# Altium footprint library My Library.PcbLib: 872 footprints (part 10 of 55)
Each footprint in its own frame and in the unit in brackets; x right, y up, seen from the top. Pads: shape width x height; smd on the part's side, far side on the other; paste and mask are expansions set on the pad; w line width, h text height; cw(c..) or ccw(c..) is an arc to the next point about the centre after c.
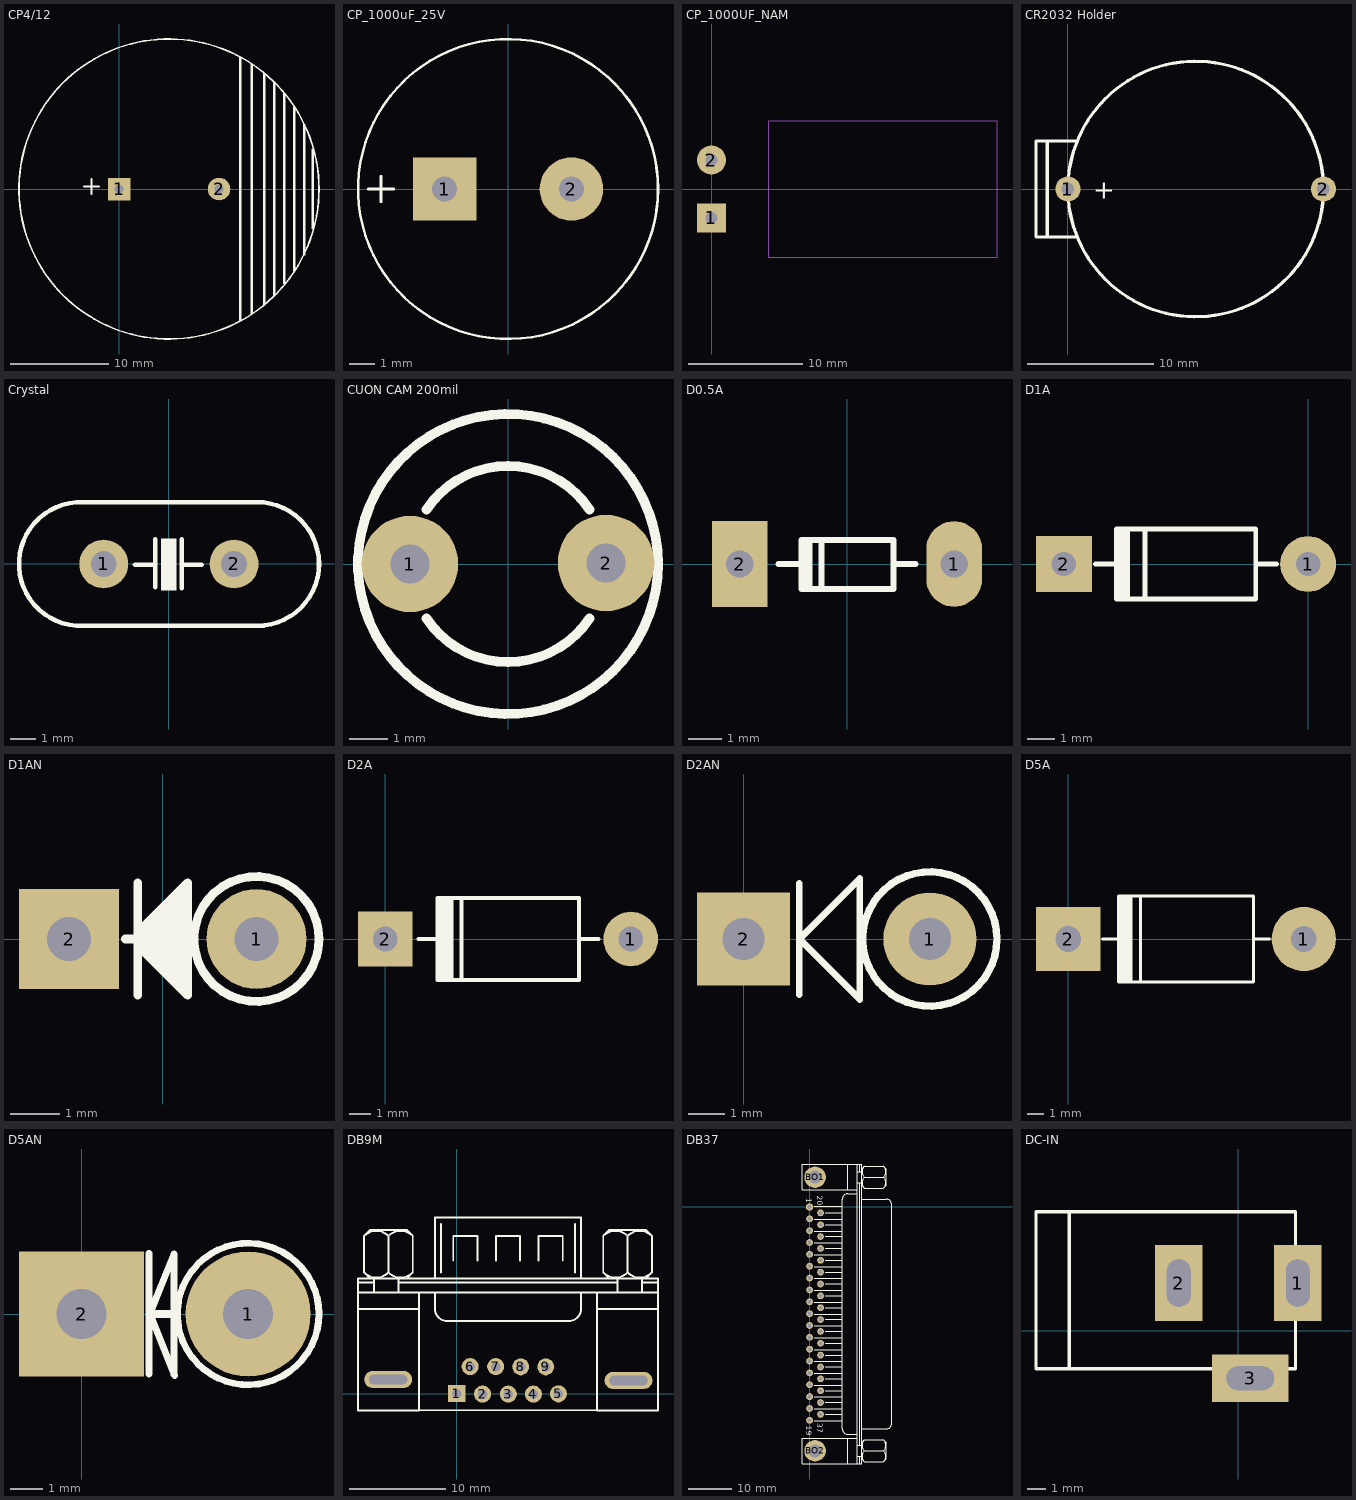
[diagram p9: the footprints below, top view; thin cyan lines are the x and y axes]

## CP4/12 [mil] "Tu hoa 220uF/450V"
height 600
pads (2):
  rect 90x90 hole 35: 1(0,0)
  round 90 hole 35: 2(400,0)
Top Overlay:
  circle w7: c200,0 r600
  rectangle: 695,-330 705,330
  rectangle: 655,-380 665,385
  rectangle: 615,-425 625,430
  rectangle: 575,-465 585,465
  rectangle: 525,-500 535,500
  rectangle: 480,-530 490,530
  rectangle: 735,-265 745,260
  rectangle: 770,-160 780,160
  lines w7: -140,10 -80,10 ; -110,-20 -110,40

## CP_1000uF_25V [mil]
pads (2):
  rect 100x100 hole 40: 1(-100,0)
  round 100 hole 40: 2(100,0)
Top Overlay:
  circle w4: c0,0 r236.22
  lines w4: -220,0 -180,0 ; -200,-20 -200,20
3D body: height 118.11, standoff 39.37, extent 236.3,-5.66 237,5.66
3D body: height 511.81, standoff 393.7, extent 236.3,-5.66 237,5.66
3D body: height 791.34, standoff 0, extent 223.5,-76.82 236.8,77.63
3D body: height 39.37, standoff -39.37, extent 84.27,-15.73 115.73,15.73
3D body: height 39.37, standoff -39.37, extent -115.73,-15.73 -84.27,15.73
3D body: height 791.34, standoff 748.03, extent -220.02,-196.87 196.87,196.87
3D body: height 787.4, standoff 0, extent -236.2,-236.2 236.2,236.2

## CP_1000UF_NAM [mil]
height 47.24
pads (2):
  rect 100x100 hole 40: 1(-1,-100)
  round 100 hole 40: 2(-1,100)
Mechanical 1:
  lines w4: 197.24,-236.22 983.86,-236.22 983.86,236.22 197.24,236.22 197.24,-236.22
3D body: height 589, standoff 196.85, extent 196.87,-196.83 984.27,196.09
3D body: height 628.06, standoff 157.48, extent 197.27,-236.2 983.88,235.31
3D body: height 413.23, standoff 374.02, extent -3,78.74 233.22,118.03
3D body: height 413.39, standoff 374.02, extent -21.05,79.95 18.11,119.15
3D body: height 393.7, standoff -78.74, extent -20.66,80.34 18.67,119.67
3D body: height 393.7, standoff -78.74, extent -20.66,-119.66 18.67,-80.33
3D body: height 413.39, standoff 374.02, extent -21.05,-120.05 18.11,-80.85
3D body: height 413.23, standoff 374.02, extent -3,-121.26 233.22,-81.97

## CR2032 Holder [mm]
pads (2):
  round 2 hole 1: 1(0,0) 2(20.32,0)
Top Overlay:
  circle w0.254: c10.16,0 r10.161
  lines w0.254: -1.651,-3.81 -1.651,3.81 ; 0.635,-3.81 -2.54,-3.81 -2.54,3.81 0.635,3.81
  text "+" at 2.032,-0.762 h1.52

## Crystal [mm]
pads (2):
  round 1.905 hole 1: 1(-2.54,0) 2(2.54,0)
Top Overlay:
  region: 0.292,0.991 0.292,-1.016 -0.292,-1.016 -0.292,0.991
  lines w0.178: -3.349,-2.412 cw(c-3.429,0) -3.348,2.412 ; -3.302,-2.413 3.452,-2.413 ; -3.302,2.413 3.429,2.413 cw(c3.437,0) 3.453,-2.413 ; -1.321,-0.025 -0.533,-0.025 ; -0.533,-0.914 -0.533,0.965 ; 0.508,-0.94 0.508,0.965 ; 0.508,-0.025 1.27,-0.025
3D body "SW3dPS-HP49US.STEP": height 3.5, standoff -4, extent -5.635,-2.286 5.715,2.364

## CUON CAM 200mil [mm]
pads (2):
  round 2.5 hole 1: 1(-2.54,0) 2(2.54,0.025)
Top Overlay:
  circle w0.254: c0,0 r3.886
  lines w0.254: -2.114,-1.409 ccw(c0,0) 2.114,-1.409 ; -2.114,1.409 cw(c0,0) 2.114,1.409

## D0.5A [mil] "Diode muoi, W 80mil, L 300mil"
height 80
pads (2):
  oval 65x100 hole 32: 1(125,0)
  rect 65x100 hole 32: 2(-125,0)
Top Overlay:
  rectangle: -55,-30 -40,25
  lines w7: -80,0 -53,0 ; -30,-29 -30,28 ; 54,0 80,0 ; -53,-29 -53,28 54,28 54,-29 -53,-29
3D body "SW3dPS-1N4148.STEP": height 61.22, standoff -50, extent -108.5,-32.96 108.5,32

## D1A [mil] "Diode 1A, W 100mil, L 350mil"
height 100
pads (2):
  round 80 hole 35: 1(0,0)
  rect 80x80 hole 35: 2(-350,0)
Top Overlay:
  rectangle: -275,-50 -255,50
  lines w7: -305,0 -275,0 ; -275,-16 -275,0 ; -275,21 -275,0 ; -234,-50 -234,47 ; -75,0 -45,0 ; -275,0 -275,50 -75,50 -75,-50 -275,-50 -275,0
3D body "SW3dPS-do_35.STEP": height 84.5, standoff -100, extent -386.49,-33 34.49,36

## D1AN [mil] "Diode 1A, W 100mil, L 150mil"
height 100
pads (2):
  round 80 hole 35: 1(75,0)
  rect 80x80 hole 35: 2(-75,0)
Top Overlay:
  circle w7: c75,0 r50
  region: 20,40 20,-40 15,-40 -20,-5 -20,5
  lines w7: -30,0 -20,0 ; -20,-45 -20,45 ; -20,-5 -20,5 20,45 20,-45 -20,-5
3D body "SW3dPS-1N4007_Stand.STEP": height 252.32, standoff -78.14, extent -64,-50 104,55

## D2A [mil] "Diode 2A, W 150mil, L 450mil"
height 100
pads (2):
  round 100 hole 45: 1(450,0)
  rect 100x100 hole 45: 2(0,0)
Top Overlay:
  rectangle: 95,-75 125,75
  lines w7: 61,0 96,0 ; 96,-31 96,0 ; 96,32 96,0 ; 140,-75 140,75 ; 355,0 391,0 ; 96,-75 96,75 355,75 355,-75 96,-75
3D body "SW3DPS-DIODE0_4-DEFAULT.STEP": height 100.5, standoff -100, extent 5,-47 435,54

## D2AN [mil] "Diode 2A, W 150mil, L 450mil"
height 100
pads (2):
  round 100 hole 45: 1(200,0)
  rect 100x100 hole 45: 2(0,0)
Top Overlay:
  circle w8: c200,0 r72.11
  lines w7: 60,-60 60,60 ; 125,50 125,65 60,0 125,-65 125,55
3D body "SW3dPS-Zener 1W_Stand.STEP": height 252.32, standoff -78.14, extent 46.01,-49.99 214.01,55

## D5A [mil] "Diode 5A, W 200mil, L 550mil"
height 150
pads (2):
  round 150 hole 60: 1(550,0)
  rect 150x150 hole 60: 2(0,0)
Top Overlay:
  rectangle: 120,-100 150,100
  lines w7: 80,0 118,0 ; 118,-44 118,0 ; 118,46 118,0 ; 169,-99 169,100 ; 432,0 470,0 ; 118,-100 432,-100 432,100 118,100 118,-100
3D body "SW3dPS-BYW98.STEP": height 254.33, standoff -86.22, extent -51.87,-106 589.87,102.66

## D5AN [mil] "Diode 5A, W 200mil, L 250mil"
height 150
pads (2):
  round 150 hole 60: 1(200,0)
  rect 150x150 hole 60: 2(0,0)
Top Overlay:
  circle w8: c200,0 r85
  lines w8: 81,-72 81,73 ; 82,0 111,72 111,-73 ; 83,-2 112,-74
  lines w10: 82,0 113,0
3D body "SW3dPS-Zener 1W_Stand.STEP": height 252.32, standoff -78.14, extent 21,-73.99 189,31

## DB9M [mil]
pads (11):
  rect 70x70 hole 39.37 unplated: 1(0,0)
  round 70 hole 39.37 unplated: 2(106,-2) 3(212,-2) 4(315,-2) 5(418,-1) 6(55,111) 7(160,111) 8(263,110) 9(366,110)
  oval 196.85x70 hole 39.37 slot 157.48 at 0 deg unplated: ""(-282,58) ""(706,54)
Top Overlay:
  lines w7.87: -190,-68.67 639,-68.67
  lines w8: -406,348 -156,348 ; -406,414.67 827.33,414.67 ; -406,456.33 -339.33,456.33 ; -381.09,497.91 ccw(c-331,548) -280.91,497.91 ; -381.09,648.09 cw(c-331,598) -280.91,648.09 ; -356,473 -381,498 -381,648 -356,673 -206,673 -181,648 -181,498 -206,473 ; -339.33,414.67 -339.33,473 ; -281.09,497.91 ccw(c-231,548) -180.91,497.91 ; -281.09,648.09 cw(c-231,598) -180.91,648.09 ; -281,498 -281,648 ; -239.33,414.67 -239.33,473 ; -239.33,456.33 660.67,456.33 ; -156,414.67 -156,-68.67 -406,-68.67 -406,473 827.33,473 827.33,-68.67 577.33,-68.67 577.33,414.67 ; -89.33,414.67 -89.33,348 ccw(c-39.33,348) -39.33,298 460.67,298 ccw(c460.67,348) 510.67,348 510.67,414.67 ; -89.33,473 -89.33,723 510.67,723 510.67,473 ; -64.33,498 -64.33,698 ; -14.33,548 -14.33,648 85.67,648 85.67,548 ; 160.67,548 160.67,648 260.67,648 260.67,548 ; 335.67,548 335.67,648 435.67,648 435.67,548 ; 485.67,498 485.67,698 ; 577.33,348 827.33,348 ; 602.25,497.91 ccw(c652.33,548) 702.42,497.91 ; 602.25,648.09 cw(c652.33,598) 702.42,648.09 ; 627.33,473 602.33,498 602.33,648 627.33,673 777.33,673 802.33,648 802.33,498 777.33,473 ; 660.67,414.67 660.67,473 ; 702.25,497.91 ccw(c752.33,548) 802.42,497.91 ; 702.25,648.09 cw(c752.33,598) 802.42,648.09 ; 702.33,498 702.33,648 ; 760.67,414.67 760.67,473 ; 760.67,456.33 827.33,456.33
3D body "DB9.step": height 494.59, standoff -152.06, extent -395.29,-63 817.3,661.41

## DB37 [mil]
pads (39):
  oct 62x62 hole 35: 1(0,0)
  round 62 hole 35: 2(0,-108.33) 3(0,-216.67) 4(0,-325) 5(0,-433.33) 6(0,-541.67) 7(0,-650) 8(0,-758.33) 9(0,-866.67) 10(0,-975) 11(0,-1083.33) 12(0,-1191.67) 13(0,-1300) 14(0,-1408.33) 15(0,-1516.67) 16(0,-1625) 17(0,-1733.33) 18(0,-1841.67) 19(0,-1950) 20(100,-54.17) 21(100,-162.5) 22(100,-270.83) 23(100,-379.17) 24(100,-487.5) 25(100,-595.83) 26(100,-704.17) 27(100,-812.5) 28(100,-920.83) 29(100,-1029.17) 30(100,-1137.5) 31(100,-1245.83) 32(100,-1354.17) 33(100,-1462.5) 34(100,-1570.83) 35(100,-1679.17) 36(100,-1787.5) 37(100,-1895.83)
  round 196.67 hole 118.33: BO1(50,271.67) BO2(50,-2228.33)
Top Overlay:
  lines w8: 41.67,-1953.33 291.67,-1953.33 300,-1953.33 ; 41.67,-1845 291.67,-1845 300,-1845 ; 41.67,-1736.67 291.67,-1736.67 300,-1736.67 ; 41.67,-1628.33 291.67,-1628.33 300,-1628.33 ; 41.67,-1520 291.67,-1520 300,-1520 ; 41.67,-1411.67 291.67,-1411.67 300,-1411.67 ; 41.67,-1303.33 291.67,-1303.33 300,-1303.33 ; 41.67,-1195 291.67,-1195 300,-1195 ; 41.67,-1086.67 300,-1086.67 ; 41.67,-978.33 300,-978.33 ; 41.67,-870 291.67,-870 300,-870 ; 41.67,-761.67 291.67,-761.67 300,-761.67 ; 41.67,-653.33 291.67,-653.33 300,-653.33 ; 41.67,-545 291.67,-545 300,-545 ; 41.67,-436.67 291.67,-436.67 300,-436.67 ; 41.67,-328.33 291.67,-328.33 300,-328.33 ; 41.67,-220 291.67,-220 300,-220 ; 41.67,-111.67 291.67,-111.67 300,-111.67 ; 41.67,5 300,5 ; 141.67,-1895 300,-1895 ; 141.67,-1786.67 300,-1786.67 ; 141.67,-1678.33 300,-1678.33 ; 141.67,-1570 300,-1570 ; 141.67,-1461.67 300,-1461.67 ; 141.67,-1353.33 300,-1353.33 ; 141.67,-1245 300,-1245 ; 141.67,-1136.67 300,-1136.67 ; 141.67,-1028.33 300,-1028.33 ; 141.67,-920 300,-920 ; 141.67,-811.67 300,-811.67 ; 141.67,-703.33 300,-703.33 ; 141.67,-595 300,-595 ; 141.67,-486.67 300,-486.67 ; 141.67,-378.33 300,-378.33 ; 141.67,-270 300,-270 ; 141.67,-161.67 300,-161.67 ; 141.67,-53.33 300,-53.33 ; 350,-2345 350,-2111.67 ; 350,155 350,388.33 ; 433.33,-2345 433.33,388.33 ; 433.33,-2278.33 475,-2278.33 ; 433.33,-2178.33 475,-2178.33 ; 433.33,-2111.67 -66.67,-2111.67 -66.67,-2345 475,-2345 475,388.33 -66.67,388.33 -66.67,155 433.33,155 ; 433.33,-2078.33 350,-2078.33 cw(c350,-2028.33) 300,-2028.33 300,71.67 cw(c350,71.67) 350,121.67 433.33,121.67 ; 433.33,221.67 475,221.67 ; 433.33,321.67 475,321.67 ; 458.33,-2345 458.33,-2278.33 ; 458.33,-2178.33 458.33,221.67 ; 458.33,321.67 458.33,388.33 ; 475,-2303.33 500,-2328.33 675,-2328.33 700,-2303.33 700,-2153.33 675,-2128.33 500,-2128.33 475,-2153.33 ; 475,-2028.33 700,-2028.33 ccw(c700,-1978.33) 750,-1978.33 750,21.67 ccw(c700,21.67) 700,71.67 475,71.67 ; 475,196.67 500,171.67 675,171.67 700,196.67 700,346.67 675,371.67 500,371.67 475,346.67 ; 499.91,-2328.42 cw(c550,-2278.33) 499.91,-2228.25 ; 499.91,-2228.42 cw(c550,-2178.33) 499.91,-2128.25 ; 499.91,171.58 cw(c550,221.67) 499.91,271.75 ; 499.91,271.58 cw(c550,321.67) 499.91,371.75 ; 500,-2228.33 675,-2228.33 ; 500,271.67 675,271.67 ; 675.09,-2328.42 ccw(c625,-2278.33) 675.09,-2228.25 ; 675.09,-2228.42 ccw(c625,-2178.33) 675.09,-2128.25 ; 675.09,171.58 ccw(c625,221.67) 675.09,271.75 ; 675.09,271.58 ccw(c625,321.67) 675.09,371.75
  text "20" at 70,101.67 h50
  text "19" at -30,-1998.33 h50
  text "37" at 70,-1978.33 h50
  text "1" at -30,81.67 h50
3D body "connector_a-df_37_a_kg-t2.stp": height 483.86, standoff -180.51, extent -65.77,-2338.25 654.7,390.88

## DC-IN [mil] "Jac DC input"
height 200
pads (3):
  rect 100x160 hole 50 slot 100 at 90 deg: 1(125,100) 2(-125,100)
  rect 160x100 hole 50 slot 100 at 0 deg: 3(25,-100)
Top Overlay:
  lines w7: -355,-80 -355,250 ; -425,-80 120,-80 120,250 -425,250 -425,-80
3D body "SW3dPS-dc range - dc connector[4840.2201].STEP": height 433.67, standoff -137.2, extent -410.35,-105.12 134,269.12